# Altium footprint library Active.PcbLib: 308 footprints (part 10 of 22) (continued)
## LFCSP48 [mm] "LFCSP48  48pin 7x7mm R0.5mm H1mm"
height 1
pads (49):
  oval 0.8x0.26 smd mask+0.051: 1(-3.45,2.75) 2(-3.45,2.25) 3(-3.45,1.75) 4(-3.45,1.25) 5(-3.45,0.75) 6(-3.45,0.25) 7(-3.45,-0.25) 8(-3.45,-0.75) 9(-3.45,-1.25) 10(-3.45,-1.75) 11(-3.45,-2.25) 12(-3.45,-2.75) 25(3.45,-2.75) 26(3.45,-2.25) 27(3.45,-1.75) 28(3.45,-1.25) 29(3.45,-0.75) 30(3.45,-0.25) 31(3.45,0.25) 32(3.45,0.75) 33(3.45,1.25) 34(3.45,1.75) 35(3.45,2.25) 36(3.45,2.75)
  oval 0.26x0.8 smd mask+0.051: 13(-2.775,-3.45) 14(-2.275,-3.45) 15(-1.775,-3.45) 16(-1.275,-3.45) 17(-0.775,-3.45) 18(-0.275,-3.45) 19(0.225,-3.45) 20(0.725,-3.45) 21(1.225,-3.45) 22(1.725,-3.45) 23(2.225,-3.45) 24(2.725,-3.45) 37(2.75,3.45) 38(2.25,3.45) 39(1.75,3.45) 40(1.25,3.45) 41(0.75,3.45) 42(0.25,3.45) 43(-0.25,3.45) 44(-0.75,3.45) 45(-1.25,3.45) 46(-1.75,3.45) 47(-2.25,3.45) 48(-2.75,3.45)
  rect 5.1x5.1 smd paste-5 mask-5: 49(0,0)
via 0,-2 diameter 0.6 hole 0.3
via 1,-2 diameter 0.6 hole 0.3
via 2,-2 diameter 0.6 hole 0.3
via -1,-2 diameter 0.6 hole 0.3
via -2,-2 diameter 0.6 hole 0.3
via 0,-1 diameter 0.6 hole 0.3
via 1,-1 diameter 0.6 hole 0.3
via 2,-1 diameter 0.6 hole 0.3
via -1,-1 diameter 0.6 hole 0.3
via -2,-1 diameter 0.6 hole 0.3
via 0,2 diameter 0.6 hole 0.3
via 1,2 diameter 0.6 hole 0.3
via 2,2 diameter 0.6 hole 0.3
via -1,2 diameter 0.6 hole 0.3
via -2,2 diameter 0.6 hole 0.3
via 0,1 diameter 0.6 hole 0.3
via 1,1 diameter 0.6 hole 0.3
via 2,1 diameter 0.6 hole 0.3
via -1,1 diameter 0.6 hole 0.3
via -2,1 diameter 0.6 hole 0.3
via -2,0 diameter 0.6 hole 0.3
via -1,0 diameter 0.6 hole 0.3
via 2,0 diameter 0.6 hole 0.3
via 1,0 diameter 0.6 hole 0.3
via 0,0 diameter 0.6 hole 0.3
Top Overlay:
  circle w0.254: c-3.8,3.65 r0.1
  lines w0.127: -3.95,-3.2 -3.6,-3.2 -3.2,-3.6 -3.2,-3.95 ; -3.95,3.2 -3.6,3.2 -3.2,3.6 -3.2,3.95 ; 3.2,-3.95 3.2,-3.6 3.6,-3.2 3.95,-3.2 ; 3.2,3.95 3.2,3.6 3.6,3.2 3.95,3.2
Top Paste:
  drawing of 36 lines, arcs and shapes, not listed
Top Solder:
  drawing of 2 lines, arcs and shapes, not listed
Mechanical 13:
  circle w0.127: c-2.65,2.65 r0.4
  lines w0.127: -3.5,-2.875 -2.875,-3.5 2.9,-3.5 3.5,-2.9 3.5,2.9 2.9,3.5 -2.9,3.5 -3.5,2.9 -3.5,-2.875
Mechanical 15:
  lines w0.1: -0.508,0 0.508,0 ; 0,-0.508 0,0.508
  lines w0.102: -4.2,-4.2 4.2,-4.2 4.2,4.2 -4.2,4.2 -4.2,-4.2
3D body: height 1.02, standoff 1, extent -3.056,2.227 -2.242,3.056
3D body: height 1, standoff 0, extent -3.5,-3.5 3.5,3.5

## LFCSP48a [mm]
height 1
pads (49):
  oval 1.3x0.3 smd mask+0.051: 1(-3.725,2.75) 2(-3.725,2.25) 3(-3.725,1.75) 4(-3.725,1.25) 5(-3.725,0.75) 6(-3.725,0.25) 7(-3.725,-0.25) 8(-3.725,-0.75) 9(-3.725,-1.25) 10(-3.725,-1.75) 11(-3.725,-2.25) 12(-3.725,-2.75) 25(3.725,-2.75) 26(3.725,-2.25) 27(3.725,-1.75) 28(3.725,-1.25) 29(3.725,-0.75) 30(3.725,-0.25) 31(3.725,0.25) 32(3.725,0.75) 33(3.725,1.25) 34(3.725,1.75) 35(3.725,2.25) 36(3.725,2.75)
  oval 0.3x1.3 smd mask+0.051: 13(-2.775,-3.725) 14(-2.275,-3.725) 15(-1.775,-3.725) 16(-1.275,-3.725) 17(-0.775,-3.725) 18(-0.275,-3.725) 19(0.225,-3.725) 20(0.725,-3.725) 21(1.225,-3.725) 22(1.725,-3.725) 23(2.225,-3.725) 24(2.725,-3.725) 37(2.75,3.725) 38(2.25,3.725) 39(1.75,3.725) 40(1.25,3.725) 41(0.75,3.725) 42(0.25,3.725) 43(-0.25,3.725) 44(-0.75,3.725) 45(-1.25,3.725) 46(-1.75,3.725) 47(-2.25,3.725) 48(-2.75,3.725)
  rect 5.1x5.1 smd paste-5 mask-5: 49(0,0)
via -0.6,-0.6 diameter 0.65 hole 0.3
via -0.6,0.6 diameter 0.65 hole 0.3
via -0.6,1.8 diameter 0.65 hole 0.3
via -0.6,-1.8 diameter 0.65 hole 0.3
via 0.6,-1.8 diameter 0.65 hole 0.3
via 0.6,1.8 diameter 0.65 hole 0.3
via 0.6,0.6 diameter 0.65 hole 0.3
via 0.6,-0.6 diameter 0.65 hole 0.3
via -1.8,-1.8 diameter 0.65 hole 0.3
via -1.8,1.8 diameter 0.65 hole 0.3
via -1.8,0.6 diameter 0.65 hole 0.3
via -1.8,-0.6 diameter 0.65 hole 0.3
via 1.8,-1.8 diameter 0.65 hole 0.3
via 1.8,1.8 diameter 0.65 hole 0.3
via 1.8,0.6 diameter 0.65 hole 0.3
via 1.8,-0.6 diameter 0.65 hole 0.3
Top Overlay:
  circle w0.254: c-4,3.6 r0.1
  lines w0.127: -4.4,-3.2 -3.6,-3.2 -3.2,-3.6 -3.2,-4.4 ; -4.4,3.2 -3.6,3.2 -3.2,3.6 -3.2,4.4 ; 3.2,-4.4 3.2,-3.6 3.6,-3.2 4.4,-3.2 ; 3.2,4.4 3.2,3.6 3.6,3.2 4.4,3.2
Top Paste:
  drawing of 25 lines, arcs and shapes, not listed
Top Solder:
  drawing of 16 lines, arcs and shapes, not listed
Mechanical 3:
  lines w0.102: -5,-3.445 -3.445,-5 ; -5,3.445 -3.445,5 ; 3.445,-5 5,-3.445 ; 3.445,5 5,3.445
Mechanical 13:
  circle w0.127: c-2.65,2.65 r0.4
  lines w0.102: -3.5,-2.875 -2.875,-3.5 ; -3.5,2.9 -2.9,3.5 ; 2.9,-3.5 3.5,-2.9 ; 2.9,3.5 3.5,2.9
  lines w0.127: -3.5,-2.875 -3.5,2.9 ; -2.9,3.5 2.9,3.5 ; -2.875,-3.5 2.9,-3.5 ; 3.5,-2.9 3.5,2.9
Mechanical 15:
  lines w0.1: -0.508,0 0.508,0 ; 0,-0.508 0,0.508
  lines w0.102: -5,-3.445 -5,3.445 ; -3.445,-5 3.445,-5 ; -3.445,5 3.445,5 ; 5,-3.445 5,3.445
3D body: height 1.02, standoff 1, extent -3.056,2.227 -2.242,3.056
3D body: height 1, standoff 0, extent -3.5,-3.5 3.5,3.5

## LFCSP64-1 [mm]
height 2.2
pads (65):
  rect 1.067x0.3 smd paste+0 mask+0.051: 1(-4.597,3.75) 2(-4.597,3.25) 3(-4.597,2.75) 4(-4.597,2.25) 5(-4.597,1.75) 6(-4.597,1.25) 7(-4.597,0.75) 8(-4.597,0.25) 9(-4.597,-0.25) 10(-4.597,-0.75) 11(-4.597,-1.25) 12(-4.597,-1.75) 13(-4.597,-2.25) 14(-4.597,-2.75) 15(-4.597,-3.25) 16(-4.597,-3.75) 33(4.597,-3.75) 34(4.597,-3.25) 35(4.597,-2.75) 36(4.597,-2.25) 37(4.597,-1.75) 38(4.597,-1.25) 39(4.597,-0.75) 40(4.597,-0.25) 41(4.597,0.25) 42(4.597,0.75) 43(4.597,1.25) 44(4.597,1.75) 45(4.597,2.25) 46(4.597,2.75) 47(4.597,3.25) 48(4.597,3.75)
  rect 0.3x1.067 smd paste+0 mask+0.051: 17(-3.75,-4.597) 18(-3.25,-4.597) 19(-2.75,-4.597) 20(-2.25,-4.597) 21(-1.75,-4.597) 22(-1.25,-4.597) 23(-0.75,-4.597) 24(-0.25,-4.597) 25(0.25,-4.597) 26(0.75,-4.597) 27(1.25,-4.597) 28(1.75,-4.597) 29(2.25,-4.597) 30(2.75,-4.597) 31(3.25,-4.597) 32(3.75,-4.597) 49(3.75,4.597) 50(3.25,4.597) 51(2.75,4.597) 52(2.25,4.597) 53(1.75,4.597) 54(1.25,4.597) 55(0.75,4.597) 56(0.25,4.597) 57(-0.25,4.597) 58(-0.75,4.597) 59(-1.25,4.597) 60(-1.75,4.597) 61(-2.25,4.597) 62(-2.75,4.597) 63(-3.25,4.597) 64(-3.75,4.597)
  rect 4.928x4.928 smd paste-12.7 mask-5: 65(0,0)
via 1,2 diameter 0.65 hole 0.3
via 0,2 diameter 0.65 hole 0.3
via -1,2 diameter 0.65 hole 0.3
via -2,1 diameter 0.65 hole 0.3
via -1,1 diameter 0.65 hole 0.3
via 0,1 diameter 0.65 hole 0.3
via 1,1 diameter 0.65 hole 0.3
via 2,1 diameter 0.65 hole 0.3
via 2,0 diameter 0.65 hole 0.3
via 1,0 diameter 0.65 hole 0.3
via 0,0 diameter 0.65 hole 0.3
via -1,0 diameter 0.65 hole 0.3
via -2,0 diameter 0.65 hole 0.3
via -2,-1 diameter 0.65 hole 0.3
via -1,-1 diameter 0.65 hole 0.3
via 0,-1 diameter 0.65 hole 0.3
via 1,-1 diameter 0.65 hole 0.3
via 2,-1 diameter 0.65 hole 0.3
via 1,-2 diameter 0.65 hole 0.3
via 0,-2 diameter 0.65 hole 0.3
via -1,-2 diameter 0.65 hole 0.3
Top Overlay:
  lines w0.127: -5.4,-4.2 -4.6,-4.2 -4.2,-4.6 -4.2,-5.4 ; -5.4,4.2 -4.6,4.2 -4.2,4.6 -4.2,5.4 ; 4.2,-5.4 4.2,-4.6 4.6,-4.2 5.4,-4.2 ; 4.2,5.4 4.2,4.6 4.6,4.2 5.4,4.2 ; -3.528,-3.528 3.528,-3.528 3.528,3.528 -2.672,3.528 -3.528,2.672 -3.528,-3.528
Top Paste:
  drawing of 28 lines, arcs and shapes, not listed
Top Solder:
  drawing of 2 lines, arcs and shapes, not listed
Mechanical 13:
  lines w0.127: -4.5,-3.9 -3.9,-4.5 3.9,-4.5 4.5,-3.9 4.5,3.9 3.9,4.5 -3.9,4.5 -4.5,3.9 -4.5,-3.9
Mechanical 15:
  lines w0.1: -0.508,0 0.508,0 ; 0,-0.508 0,0.508
  lines w0.102: -5.969,-4.445 -5.969,4.445 -4.445,5.969 4.445,5.969 5.969,4.445 5.969,-4.445 4.445,-5.969 -4.445,-5.969 -5.969,-4.445
3D body: height 1, standoff 0, extent -4.5,-4.6 4.5,4.4

## LFCSP64-2 [mm]
pads (65):
  rect 1.3x0.3 smd mask+0.051: 1(-4.7,3.75) 2(-4.7,3.25) 3(-4.7,2.75) 4(-4.7,2.25) 5(-4.7,1.75) 6(-4.7,1.25) 7(-4.7,0.75) 8(-4.7,0.25) 9(-4.7,-0.25) 10(-4.7,-0.75) 11(-4.7,-1.25) 12(-4.7,-1.75) 13(-4.7,-2.25) 14(-4.7,-2.75) 15(-4.7,-3.25) 16(-4.7,-3.75) 33(4.7,-3.75) 34(4.7,-3.25) 35(4.7,-2.75) 36(4.7,-2.25) 37(4.7,-1.75) 38(4.7,-1.25) 39(4.7,-0.75) 40(4.7,-0.25) 41(4.7,0.25) 42(4.7,0.75) 43(4.7,1.25) 44(4.7,1.75) 45(4.7,2.25) 46(4.7,2.75) 47(4.7,3.25) 48(4.7,3.75)
  rect 0.3x1.3 smd mask+0.051: 17(-3.75,-4.7) 18(-3.25,-4.7) 19(-2.75,-4.7) 20(-2.25,-4.7) 21(-1.75,-4.7) 22(-1.25,-4.7) 23(-0.75,-4.7) 24(-0.25,-4.7) 25(0.25,-4.7) 26(0.75,-4.7) 27(1.25,-4.7) 28(1.75,-4.7) 29(2.25,-4.7) 30(2.75,-4.7) 31(3.25,-4.7) 32(3.75,-4.7) 49(3.75,4.7) 50(3.25,4.7) 51(2.75,4.7) 52(2.25,4.7) 53(1.75,4.7) 54(1.25,4.7) 55(0.75,4.7) 56(0.25,4.7) 57(-0.25,4.7) 58(-0.75,4.7) 59(-1.25,4.7) 60(-1.75,4.7) 61(-2.25,4.7) 62(-2.75,4.7) 63(-3.25,4.7) 64(-3.75,4.7)
  rect 4.928x4.928 smd paste-5 mask-5: 65(0,0)
via -0.6,-0.6 diameter 0.65 hole 0.3
via -0.6,0.6 diameter 0.65 hole 0.3
via -0.6,1.8 diameter 0.65 hole 0.3
via -0.6,-1.8 diameter 0.65 hole 0.3
via 0.6,-1.8 diameter 0.65 hole 0.3
via 0.6,1.8 diameter 0.65 hole 0.3
via 0.6,0.6 diameter 0.65 hole 0.3
via 0.6,-0.6 diameter 0.65 hole 0.3
via -1.8,-1.8 diameter 0.65 hole 0.3
via -1.8,1.8 diameter 0.65 hole 0.3
via -1.8,0.6 diameter 0.65 hole 0.3
via -1.8,-0.6 diameter 0.65 hole 0.3
via 1.8,-1.8 diameter 0.65 hole 0.3
via 1.8,1.8 diameter 0.65 hole 0.3
via 1.8,0.6 diameter 0.65 hole 0.3
via 1.8,-0.6 diameter 0.65 hole 0.3
Top Overlay:
  circle w0.254: c-5,4.6 r0.1
  lines w0.127: -5.4,-4.2 -4.6,-4.2 -4.2,-4.6 -4.2,-5.4 ; -5.4,4.2 -4.6,4.2 -4.2,4.6 -4.2,5.4 ; 4.2,-5.4 4.2,-4.6 4.6,-4.2 5.4,-4.2 ; 4.2,5.4 4.2,4.6 4.6,4.2 5.4,4.2 ; -3.528,-3.528 3.528,-3.528 3.528,3.528 -2.672,3.528 -3.528,2.672 -3.528,-3.528
Top Paste:
  drawing of 25 lines, arcs and shapes, not listed
Top Solder:
  drawing of 16 lines, arcs and shapes, not listed
Mechanical 13:
  circle w0.127: c-3.65,3.65 r0.4
  lines w0.127: -4.5,-3.9 -3.9,-4.5 3.9,-4.5 4.5,-3.9 4.5,3.9 3.9,4.5 -3.9,4.5 -4.5,3.9 -4.5,-3.9
Mechanical 15:
  lines w0.1: -0.508,0 0.508,0 ; 0,-0.508 0,0.508
  lines w0.102: -5.969,-4.445 -5.969,4.445 -4.445,5.969 4.445,5.969 5.969,4.445 5.969,-4.445 4.445,-5.969 -4.445,-5.969 -5.969,-4.445
3D body: height 1, standoff 0, extent -4.5,-4.6 4.5,4.4

## LGA50 [mm] "LGA, 50-Leads, Body 11,25x9,0mm,  Pitch 1,27mm"
height 2.92
pads (50):
  rect 0.665x0.665 smd: A1(-4.445,-3.81) A2(-4.445,-2.54) A3(-4.445,-1.27) A4(-4.445,0) A5(-4.445,1.27) A6(-4.445,2.54) A7(-4.445,3.81) B1(-3.175,-3.81) B2(-3.175,-2.54) B3(-3.175,-1.27) B4(-3.175,0) B5(-3.175,1.27) B6(-3.175,2.54) B7(-3.175,3.81) C1(-1.905,-3.81) C2(-1.905,-2.54) C3(-1.905,-1.27) C4(-1.905,0) C5(-1.905,1.27) C6(-1.905,2.54) C7(-1.905,3.81) D1(-0.635,-3.81) D2(-0.635,-2.54) D3(-0.635,-1.27) D4(-0.635,0) D5(-0.635,1.27) D6(-0.635,2.54) D7(-0.635,3.81) E1(0.635,-3.81) E2(0.635,-2.54) E3(0.635,-1.27) E4(0.635,0) E5(0.635,1.27) E6(0.635,2.54) E7(0.635,3.81) F5(1.905,1.27) F6(1.905,2.54) F7(1.905,3.81) G1(3.175,-3.81) G2(3.175,-2.54) G3(3.175,-1.27) G5(3.175,1.27) G6(3.175,2.54) G7(3.175,3.81) H1(4.445,-3.81) H2(4.445,-2.54) H3(4.445,-1.27) H5(4.445,1.27) H6(4.445,2.54) H7(4.445,3.81)
Top Overlay:
  circle w0.25: c-6.225,-3.3 r0.125
  region: -5.62,4.5 -5.625,4.495 -5.625,4.5
  lines w0.15: -5.625,4.495 -5.62,4.5 ; -5.625,-4.5 -5.625,4.5 5.625,4.5 5.625,-4.5 -5.625,-4.5
Mechanical 13:
  circle w0.127: c-4.308,-3.3 r0.608
  lines w0.1: -5.625,-4.5 5.625,-4.5 5.625,4.5 -5.625,4.5 -5.625,-4.5
Mechanical 15:
  lines w0.1: -0.5,0 0.5,0 ; 0,-0.5 0,0.5 ; -6.625,-5.6 -6.625,5.5 6.7,5.5 6.7,-5.6 -6.625,-5.6
3D body: height 2.92, standoff 0, extent -5.662,-4.5 5.588,4.5
3D body: height 2.93, standoff 2.92, extent -4.913,-3.978 -3.681,-2.755

## LGA71 [mm] "LGA, 71-Leads, Body 15,0x9,0mm,  Pitch 1,27mm"
height 2.82
pads (71):
  rect 0.665x0.665 smd: A1(-6.35,-3.81) A2(-6.35,-2.54) A3(-6.35,-1.27) A4(-6.35,0) A5(-6.35,1.27) A6(-6.35,2.54) A7(-6.35,3.81) B1(-5.08,-3.81) B2(-5.08,-2.54) B3(-5.08,-1.27) B4(-5.08,0) B5(-5.08,1.27) B6(-5.08,2.54) B7(-5.08,3.81) C1(-3.81,-3.81) C2(-3.81,-2.54) C3(-3.81,-1.27) C4(-3.81,0) C5(-3.81,1.27) C6(-3.81,2.54) C7(-3.81,3.81) D1(-2.54,-3.81) D2(-2.54,-2.54) D3(-2.54,-1.27) D4(-2.54,0) D5(-2.54,1.27) D6(-2.54,2.54) D7(-2.54,3.81) E1(-1.27,-3.81) E2(-1.27,-2.54) E3(-1.27,-1.27) E4(-1.27,0) E5(-1.27,1.27) E6(-1.27,2.54) E7(-1.27,3.81) F1(0,-3.81) F2(0,-2.54) F3(0,-1.27) F4(0,0) F5(0,1.27) F6(0,2.54) F7(0,3.81) G1(1.27,-3.81) G2(1.27,-2.54) G3(1.27,-1.27) G4(1.27,0) G5(1.27,1.27) G6(1.27,2.54) G7(1.27,3.81) H1(2.54,-3.81) H2(2.54,-2.54) H3(2.54,-1.27) H4(2.54,0) H5(2.54,1.27) H6(2.54,2.54) H7(2.54,3.81) J5(3.81,1.27) J6(3.81,2.54) J7(3.81,3.81) K1(5.08,-3.81) K2(5.08,-2.54) K3(5.08,-1.27) K5(5.08,1.27) K6(5.08,2.54) K7(5.08,3.81) L1(6.35,-3.81) L2(6.35,-2.54) L3(6.35,-1.27) L5(6.35,1.27) L6(6.35,2.54) L7(6.35,3.81)
Top Overlay:
  circle w0.25: c-7.999,-3.835 r0.125
  region: -7.525,4.5 -7.53,4.495 -7.53,4.5
  lines w0.15: -7.53,4.495 -7.525,4.5 ; -7.53,-4.5 7.62,-4.5 7.62,4.5 -7.53,4.5 -7.53,-4.5
Mechanical 13:
  circle w0.127: c-6.213,-3.3 r0.608
  lines w0.1: -7.53,-4.5 -7.53,4.5 7.53,4.5 7.53,-4.5 -7.53,-4.5
Mechanical 15:
  lines w0.1: -0.5,0 0.5,0 ; 0,-0.5 0,0.5 ; -8.1,-5 8.1,-5 8.1,5 -8.1,5 -8.1,-5
3D body: height 2.93, standoff 2.92, extent -6.818,-3.978 -5.586,-2.755
3D body: height 2.92, standoff 0.1, extent -7.567,-4.5 7.53,4.5

## LGA76 [mm] "LGA, 76-Leads, Body 15,0x11,25mm,  Pitch 1,27mm"
height 4.32
pads (76):
  round 0.635 smd: A1(-6.35,-4.445)
  rect 0.635x0.635 smd: A2(-6.35,-3.175) A3(-6.35,-1.905) A4(-6.35,-0.635) A5(-6.35,0.635) A6(-6.35,1.905) A7(-6.35,3.175) A8(-6.35,4.445) B1(-5.08,-4.445) B2(-5.08,-3.175) B3(-5.08,-1.905) B4(-5.08,-0.635) B5(-5.08,0.635) B6(-5.08,1.905) B7(-5.08,3.175) B8(-5.08,4.445) C1(-3.81,-4.445) C2(-3.81,-3.175) C3(-3.81,-1.905) C4(-3.81,-0.635) C5(-3.81,0.635) C6(-3.81,1.905) C7(-3.81,3.175) C8(-3.81,4.445) D1(-2.54,-4.445) D2(-2.54,-3.175) D3(-2.54,-1.905) D4(-2.54,-0.635) D5(-2.54,0.635) D6(-2.54,1.905) D7(-2.54,3.175) D8(-2.54,4.445) E1(-1.27,-4.445) E2(-1.27,-3.175) E3(-1.27,-1.905) E4(-1.27,-0.635) E5(-1.27,0.635) E6(-1.27,1.905) E7(-1.27,3.175) E8(-1.27,4.445) F1(0,-4.445) F2(0,-3.175) F3(0,-1.905) F4(0,-0.635) F5(0,0.635) F6(0,1.905) F7(0,3.175) F8(0,4.445) G1(1.27,-4.445) G2(1.27,-3.175) G3(1.27,-1.905) G4(1.27,-0.635) G5(1.27,0.635) G6(1.27,1.905) G7(1.27,3.175) G8(1.27,4.445) H5(2.54,0.635) H6(2.54,1.905) J1(3.81,-4.445) J2(3.81,-3.175) J3(3.81,-1.905) J5(3.81,0.635) J6(3.81,1.905) J8(3.81,4.445) K1(5.08,-4.445) K2(5.08,-3.175) K3(5.08,-1.905) K5(5.08,0.635) K6(5.08,1.905) K8(5.08,4.445) L1(6.35,-4.445) L2(6.35,-3.175) L3(6.35,-1.905) L5(6.35,0.635) L6(6.35,1.905) L8(6.35,4.445)
Top Overlay:
  circle w0.25: c-7.999,-4.47 r0.125
  lines w0.15: -7.5,-5.625 7.5,-5.625 7.5,5.625 -7.5,5.625 -7.5,-5.625
Mechanical 13:
  circle w0.127: c-6.213,-3.935 r0.608
  lines w0.1: -7.5,-5.625 -7.5,5.625 7.5,5.625 7.5,-5.625 -7.5,-5.625
Mechanical 15:
  lines w0.1: -0.5,0 0.5,0 ; 0,-0.5 0,0.5 ; -7.8,-5.9 7.8,-5.9 7.8,5.9 -7.8,5.9 -7.8,-5.9
3D body: height 4.43, standoff 4.42, extent -6.818,-4.613 -5.586,-3.39
3D body: height 4.42, standoff 0.1, extent -7.5,-5.625 7.5,5.625

## LGA118 [mm] "LGA, 118-Leads, Body 15,0x15,0mm,  Pitch 1,27mm"
height 2.92
pads (118):
  rect 0.7x0.7 smd: A1(-6.985,6.985) A2(-5.715,6.985) A3(-4.445,6.985) A4(-3.175,6.985) A5(-1.905,6.985) A6(-0.635,6.985) A7(0.635,6.985) A8(1.905,6.985) A9(3.175,6.985) A10(4.445,6.985) A11(5.715,6.985) A12(6.985,6.985) B1(-6.985,5.715) B2(-5.715,5.715) B3(-4.445,5.715) B4(-3.175,5.715) B5(-1.905,5.715) B6(-0.635,5.715) B12(6.985,5.715) C1(-6.985,4.445) C2(-5.715,4.445) C3(-4.445,4.445) C4(-3.175,4.445) C5(-1.905,4.445) C6(-0.635,4.445) C12(6.985,4.445) D1(-6.985,3.175) D2(-5.715,3.175) D3(-4.445,3.175) D4(-3.175,3.175) D5(-1.905,3.175) D6(-0.635,3.175) D12(6.985,3.175) E1(-6.985,1.905) E2(-5.715,1.905) E3(-4.445,1.905) E4(-3.175,1.905) E5(-1.905,1.905) E6(-0.635,1.905) E7(0.635,1.905) E12(6.985,1.905) F1(-6.985,0.635) F2(-5.715,0.635) F3(-4.445,0.635) F4(-3.175,0.635) F5(-1.905,0.635) F6(-0.635,0.635) F7(0.635,0.635) F8(1.905,0.635) F9(3.175,0.635) F12(6.985,0.635) G1(-6.985,-0.635) G2(-5.715,-0.635) G3(-4.445,-0.635) G4(-3.175,-0.635) G5(-1.905,-0.635) G6(-0.635,-0.635) G7(0.635,-0.635) G8(1.905,-0.635) G9(3.175,-0.635) G12(6.985,-0.635) H1(-6.985,-1.905) H2(-5.715,-1.905) H3(-4.445,-1.905) H4(-3.175,-1.905) H5(-1.905,-1.905) H6(-0.635,-1.905) H7(0.635,-1.905) H8(1.905,-1.905) H9(3.175,-1.905) H12(6.985,-1.905) J1(-6.985,-3.175) J2(-5.715,-3.175) J3(-4.445,-3.175) J4(-3.175,-3.175) J5(-1.905,-3.175) J6(-0.635,-3.175) J7(0.635,-3.175) J8(1.905,-3.175) J9(3.175,-3.175) J10(4.445,-3.175) J12(6.985,-3.175) K1(-6.985,-4.445) K2(-5.715,-4.445) K3(-4.445,-4.445) K4(-3.175,-4.445) K5(-1.905,-4.445) K6(-0.635,-4.445) K7(0.635,-4.445) K8(1.905,-4.445) K9(3.175,-4.445) K10(4.445,-4.445) K11(5.715,-4.445) K12(6.985,-4.445) L1(-6.985,-5.715) L2(-5.715,-5.715) L3(-4.445,-5.715) L4(-3.175,-5.715) L5(-1.905,-5.715) L6(-0.635,-5.715) L7(0.635,-5.715) L8(1.905,-5.715) L9(3.175,-5.715) L10(4.445,-5.715) L11(5.715,-5.715) L12(6.985,-5.715) M1(-6.985,-6.985) M2(-5.715,-6.985) M3(-4.445,-6.985) M4(-3.175,-6.985) M5(-1.905,-6.985) M6(-0.635,-6.985) M7(0.635,-6.985) M8(1.905,-6.985) M9(3.175,-6.985) M10(4.445,-6.985) M11(5.715,-6.985) M12(6.985,-6.985)
Top Overlay:
  circle w0.25: c-8.125,6.985 r0.125
  region: -7.495,7.5 -7.5,7.495 -7.5,7.5
  lines w0.15: -7.5,7.495 -7.495,7.5 ; -7.5,-7.5 7.5,-7.5 7.5,7.5 -7.5,7.5 -7.5,-7.5
Mechanical 13:
  circle w0.127: c-6.4,6.4 r0.608
  lines w0.1: -7.5,-7.5 7.5,-7.5 7.5,7.5 -7.5,7.5 -7.5,-7.5
Mechanical 15:
  lines w0.1: -0.5,0 0.5,0 ; 0,-0.5 0,0.5 ; -8.5,-8.5 8.5,-8.5 8.5,8.5 -8.5,8.5 -8.5,-8.5
3D body: height 2.92, standoff 0.05, extent -7.5,-7.5 7.5,7.5
3D body: height 2.93, standoff 2.92, extent -7.012,5.788 -5.78,7.012

## LGA133 [mm] "LGA 133-Leads Body 15,0x15,0mm  R1,27mm"
height 2.92
pads (133):
  rect 0.7x0.7 smd paste-0.038: A1(-6.985,6.985) A2(-5.715,6.985) A3(-4.445,6.985) A4(-3.175,6.985) A5(-1.905,6.985) A6(-0.635,6.985) A7(0.635,6.985) A8(1.905,6.985) A9(3.175,6.985) A10(4.445,6.985) A11(5.715,6.985) A12(6.985,6.985) B1(-6.985,5.715) B2(-5.715,5.715) B3(-4.445,5.715) B4(-3.175,5.715) B5(-1.905,5.715) B6(-0.635,5.715) B7(0.635,5.715) B9(3.175,5.715) B11(5.715,5.715) B12(6.985,5.715) C1(-6.985,4.445) C2(-5.715,4.445) C3(-4.445,4.445) C4(-3.175,4.445) C5(-1.905,4.445) C6(-0.635,4.445) C7(0.635,4.445) C10(4.445,4.445) C11(5.715,4.445) C12(6.985,4.445) D1(-6.985,3.175) D2(-5.715,3.175) D3(-4.445,3.175) D4(-3.175,3.175) D5(-1.905,3.175) D6(-0.635,3.175) D9(3.175,3.175) D11(5.715,3.175) D12(6.985,3.175) E1(-6.985,1.905) E2(-5.715,1.905) E3(-4.445,1.905) E4(-3.175,1.905) E5(-1.905,1.905) E6(-0.635,1.905) E7(0.635,1.905) E8(1.905,1.905) E11(5.715,1.905) E12(6.985,1.905) F1(-6.985,0.635) F2(-5.715,0.635) F3(-4.445,0.635) F4(-3.175,0.635) F5(-1.905,0.635) F6(-0.635,0.635) F7(0.635,0.635) F8(1.905,0.635) F9(3.175,0.635) F12(6.985,0.635) G1(-6.985,-0.635) G2(-5.715,-0.635) G3(-4.445,-0.635) G4(-3.175,-0.635) G5(-1.905,-0.635) G6(-0.635,-0.635) G7(0.635,-0.635) G8(1.905,-0.635) G9(3.175,-0.635) G10(4.445,-0.635) G11(5.715,-0.635) G12(6.985,-0.635) H1(-6.985,-1.905) H2(-5.715,-1.905) H3(-4.445,-1.905) H4(-3.175,-1.905) H5(-1.905,-1.905) H6(-0.635,-1.905) H7(0.635,-1.905) H8(1.905,-1.905) H9(3.175,-1.905) H10(4.445,-1.905) H11(5.715,-1.905) H12(6.985,-1.905) J1(-6.985,-3.175) J2(-5.715,-3.175) J3(-4.445,-3.175) J4(-3.175,-3.175) J5(-1.905,-3.175) J6(-0.635,-3.175) J7(0.635,-3.175) J8(1.905,-3.175) J9(3.175,-3.175) J10(4.445,-3.175) J11(5.715,-3.175) J12(6.985,-3.175) K1(-6.985,-4.445) K2(-5.715,-4.445) K3(-4.445,-4.445) K4(-3.175,-4.445) K5(-1.905,-4.445) K6(-0.635,-4.445) K7(0.635,-4.445) K8(1.905,-4.445) K9(3.175,-4.445) K10(4.445,-4.445) K11(5.715,-4.445) K12(6.985,-4.445) L1(-6.985,-5.715) L2(-5.715,-5.715) L3(-4.445,-5.715) L4(-3.175,-5.715) L5(-1.905,-5.715) L6(-0.635,-5.715) L7(0.635,-5.715) L8(1.905,-5.715) L9(3.175,-5.715) L10(4.445,-5.715) L11(5.715,-5.715) L12(6.985,-5.715) M1(-6.985,-6.985) M2(-5.715,-6.985) M3(-4.445,-6.985) M4(-3.175,-6.985) M5(-1.905,-6.985) M6(-0.635,-6.985) M7(0.635,-6.985) M8(1.905,-6.985) M9(3.175,-6.985) M10(4.445,-6.985) M11(5.715,-6.985) M12(6.985,-6.985)
Top Overlay:
  circle w0.25: c-8.125,6.985 r0.125
  region: -7.495,7.5 -7.5,7.495 -7.5,7.5
  lines w0.15: -7.5,7.495 -7.495,7.5 ; -7.5,-7.5 -7.5,7.5 7.5,7.5 7.5,-7.5 -7.5,-7.5
Mechanical 13:
  circle w0.127: c-6.4,6.4 r0.608
  lines w0.1: -7.5,-7.5 -7.5,7.5 7.5,7.5 7.5,-7.5 -7.5,-7.5
Mechanical 15:
  lines w0.1: -0.5,0 0.5,0 ; 0,-0.5 0,0.5 ; -8.5,-8.5 -8.5,8.5 8.5,8.5 8.5,-8.5 -8.5,-8.5
3D body: height 2.92, standoff 0.05, extent -7.5,-7.5 7.5,7.5
3D body: height 2.93, standoff 2.92, extent -7.012,5.788 -5.78,7.012

## LGA141 [mm] "LGA, 141-Leads, Body 15,0x15,0mm,  Pitch 1,27mm"
height 2.92
pads (141):
  rect 0.7x0.7 smd: A1(-6.985,6.985) A2(-6.985,5.715) A3(-6.985,4.445) A4(-6.985,3.175) A5(-6.985,1.905) A6(-6.985,0.635) A7(-6.985,-0.635) A8(-6.985,-1.905) A9(-6.985,-3.175) A10(-6.985,-4.445) A11(-6.985,-5.715) A12(-6.985,-6.985) B1(-5.715,6.985) B2(-5.715,5.715) B3(-5.715,4.445) B4(-5.715,3.175) B5(-5.715,1.905) B6(-5.715,0.635) B7(-5.715,-0.635) B8(-5.715,-1.905) B9(-5.715,-3.175) B10(-5.715,-4.445) B11(-5.715,-5.715) B12(-5.715,-6.985) C1(-4.445,6.985) C2(-4.445,5.715) C3(-4.445,4.445) C4(-4.445,3.175) C5(-4.445,1.905) C6(-4.445,0.635) C7(-4.445,-0.635) C8(-4.445,-1.905) C9(-4.445,-3.175) C10(-4.445,-4.445) C11(-4.445,-5.715) C12(-4.445,-6.985) D1(-3.175,6.985) D2(-3.175,5.715) D3(-3.175,4.445) D4(-3.175,3.175) D5(-3.175,1.905) D6(-3.175,0.635) D7(-3.175,-0.635) D8(-3.175,-1.905) D9(-3.175,-3.175) D10(-3.175,-4.445) D11(-3.175,-5.715) D12(-3.175,-6.985) E1(-1.905,6.985) E2(-1.905,5.715) E3(-1.905,4.445) E4(-1.905,3.175) E5(-1.905,1.905) E6(-1.905,0.635) E7(-1.905,-0.635) E8(-1.905,-1.905) E9(-1.905,-3.175) E10(-1.905,-4.445) E11(-1.905,-5.715) E12(-1.905,-6.985) F1(-0.635,6.985) F2(-0.635,5.715) F3(-0.635,4.445) F4(-0.635,3.175) F5(-0.635,1.905) F6(-0.635,0.635) F10(-0.635,-4.445) F11(-0.635,-5.715) F12(-0.635,-6.985) G1(0.635,6.985) G2(0.635,5.715) G3(0.635,4.445) G4(0.635,3.175) G5(0.635,1.905) G6(0.635,0.635) G7(0.635,-0.635) G8(0.635,-1.905) G9(0.635,-3.175) G10(0.635,-4.445) G11(0.635,-5.715) G12(0.635,-6.985) H1(1.905,6.985) H2(1.905,5.715) H3(1.905,4.445) H4(1.905,3.175) H5(1.905,1.905) H6(1.905,0.635) H7(1.905,-0.635) H8(1.905,-1.905) H9(1.905,-3.175) H10(1.905,-4.445) H11(1.905,-5.715) H12(1.905,-6.985) J1(3.175,6.985) J2(3.175,5.715) J3(3.175,4.445) J4(3.175,3.175) J5(3.175,1.905) J6(3.175,0.635) J7(3.175,-0.635) J8(3.175,-1.905) J9(3.175,-3.175) J10(3.175,-4.445) J11(3.175,-5.715) J12(3.175,-6.985) K1(4.445,6.985) K2(4.445,5.715) K3(4.445,4.445) K4(4.445,3.175) K5(4.445,1.905) K6(4.445,0.635) K7(4.445,-0.635) K8(4.445,-1.905) K9(4.445,-3.175) K10(4.445,-4.445) K11(4.445,-5.715) K12(4.445,-6.985) L1(5.715,6.985) L2(5.715,5.715) L3(5.715,4.445) L4(5.715,3.175) L5(5.715,1.905) L6(5.715,0.635) L7(5.715,-0.635) L8(5.715,-1.905) L9(5.715,-3.175) L10(5.715,-4.445) L11(5.715,-5.715) L12(5.715,-6.985) M1(6.985,6.985) M2(6.985,5.715) M3(6.985,4.445) M4(6.985,3.175) M5(6.985,1.905) M6(6.985,0.635) M7(6.985,-0.635) M8(6.985,-1.905) M9(6.985,-3.175) M10(6.985,-4.445) M11(6.985,-5.715) M12(6.985,-6.985)
Top Overlay:
  circle w0.25: c-8.125,6.985 r0.125
  region: -7.495,7.5 -7.5,7.495 -7.5,7.5
  lines w0.15: -7.5,7.495 -7.495,7.5 ; -7.5,-7.5 7.5,-7.5 7.5,7.5 -7.5,7.5 -7.5,-7.5
Mechanical 13:
  circle w0.127: c-6.4,6.4 r0.608
  lines w0.1: -7.5,-7.5 7.5,-7.5 7.5,7.5 -7.5,7.5 -7.5,-7.5
Mechanical 15:
  lines w0.1: -0.5,0 0.5,0 ; 0,-0.5 0,0.5 ; -8.5,-8.5 8.5,-8.5 8.5,8.5 -8.5,8.5 -8.5,-8.5
3D body: height 2.93, standoff 2.92, extent -7.012,5.788 -5.78,7.012
3D body: height 2.92, standoff 0.05, extent -7.5,-7.5 7.5,7.5